# Altium footprint library PCB-Tester-Board-V1.PcbLib: 48 footprints (part 3 of 3)
Each footprint in its own frame and in the unit in brackets; x right, y up, seen from the top. Pads: shape width x height; smd on the part's side, far side on the other; paste and mask are expansions set on the pad; w line width, h text height; cw(c..) or ccw(c..) is an arc to the next point about the centre after c.
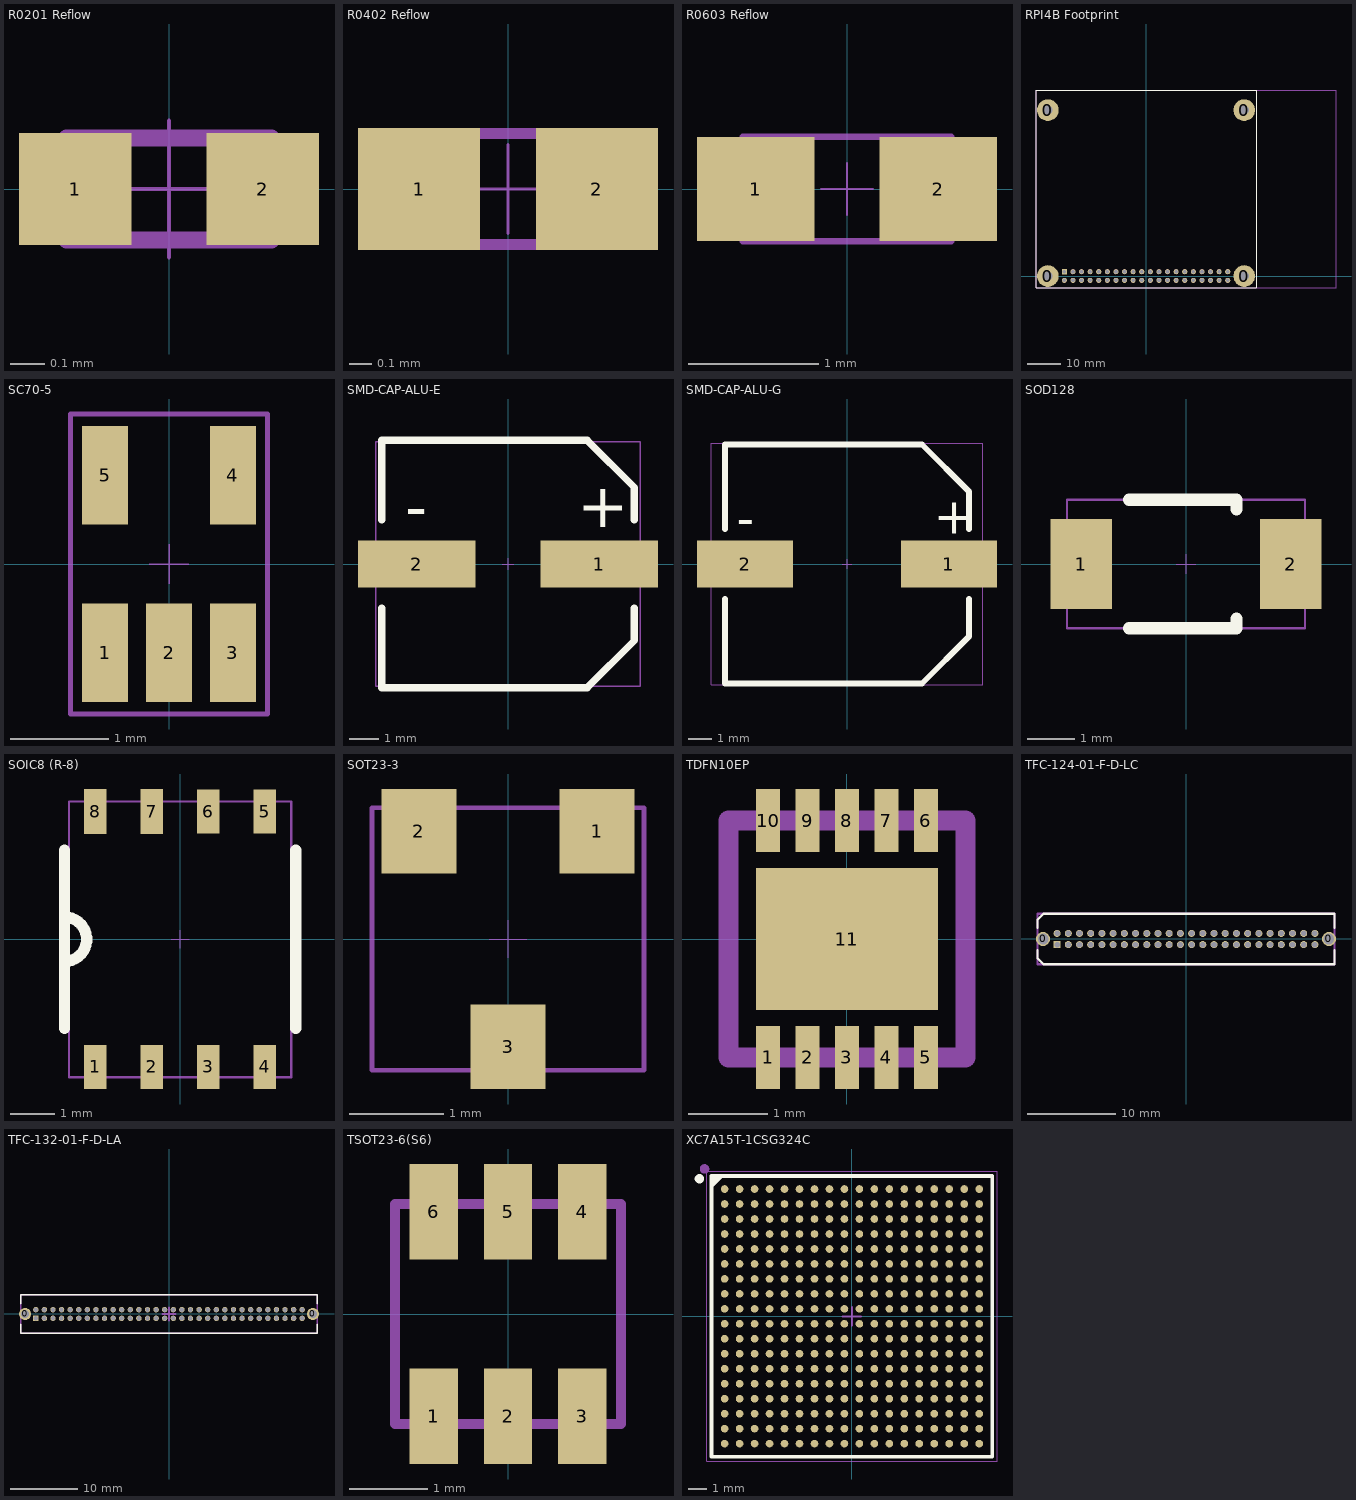
[diagram p2: the footprints below, top view; thin cyan lines are the x and y axes]

## R0201 Reflow [mm] "SMT Resistor 0201 Reflow Soldering"
pads (2):
  rect 0.33x0.33 smd: 1(-0.275,0) 2(0.275,0)
Top Solder:
  rectangle: -0.27,-0.267 0.238,0.267
Top Courtyard:
  lines w0.05: -0.3,-0.15 0.3,-0.15 0.3,0.15 -0.3,0.15 -0.3,-0.15
Mechanical 17:
  lines w0.013: -0.2,0 0.2,0 ; 0,-0.2 0,0.2
3D body "R0201.STEP": height 0.23, standoff 0, extent -0.3,-0.15 0.3,0.15

## R0402 Reflow [mm] "SMT Resistor 0402 Reflow Soldering"
pads (2):
  rect 0.55x0.55 smd: 1(-0.4,0) 2(0.4,0)
Top Solder:
  rectangle: -0.3,-0.377 0.3,0.377
Top Courtyard:
  lines w0.05: -0.5,-0.25 0.5,-0.25 0.5,0.25 -0.5,0.25 -0.5,-0.25
Mechanical 17:
  lines w0.013: -0.2,0 0.2,0 ; 0,-0.2 0,0.2
3D body "R0402.STEP": height 0.35, standoff 0, extent -0.5,-0.25 0.5,0.25

## R0603 Reflow [mm] "SMT Resistor 0603 Reflow Soldering"
pads (2):
  rect 0.9x0.8 smd: 1(-0.7,0) 2(0.7,0)
Top Courtyard:
  lines w0.05: -0.8,-0.4 -0.8,0.4 0.8,0.4 0.8,-0.4 -0.8,-0.4
Mechanical 17:
  lines w0.013: -0.2,0 0.2,0 ; 0,-0.2 0,0.2
3D body "R0603.STEP": height 0.45, standoff 0, extent -0.8,-0.4 0.8,0.4

## RPI4B [mm] "Raspberry Pi 4B"
3D body "RPI4B.STEP": height 19.79, standoff -0.11, extent -32.5,-3.5 56.49,54.9

## RPI4B Footprint [mm] "Footprint for Raspberry Pi 4B"
pads (44):
  round 6.4 hole 2.7 unplated paste-6.5: 0(-29,0) 0(-29,49) 0(29,0) 0(29,49)
  rect 1.5x1.5 hole 1.1 paste-2: 1(-24.13,1.27)
  round 1.5 hole 1.1 paste-2: 2(-24.13,-1.27) 3(-21.59,1.27) 4(-21.59,-1.27) 5(-19.05,1.27) 6(-19.05,-1.27) 7(-16.51,1.27) 8(-16.51,-1.27) 9(-13.97,1.27) 10(-13.97,-1.27) 11(-11.43,1.27) 12(-11.43,-1.27) 13(-8.89,1.27) 14(-8.89,-1.27) 15(-6.35,1.27) 16(-6.35,-1.27) 17(-3.81,1.27) 18(-3.81,-1.27) 19(-1.27,1.27) 20(-1.27,-1.27) 21(1.27,1.27) 22(1.27,-1.27) 23(3.81,1.27) 24(3.81,-1.27) 25(6.35,1.27) 26(6.35,-1.27) 27(8.89,1.27) 28(8.89,-1.27) 29(11.43,1.27) 30(11.43,-1.27) 31(13.97,1.27) 32(13.97,-1.27) 33(16.51,1.27) 34(16.51,-1.27) 35(19.05,1.27) 36(19.05,-1.27) 37(21.59,1.27) 38(21.59,-1.27) 39(24.13,1.27) 40(24.13,-1.27)
Top Overlay:
  lines w0.254: -32.5,-3.5 -32.5,54.9 32.5,54.9 32.5,-3.5 -32.5,-3.5
Top Courtyard:
  lines w0.254: -32.5,-3.5 56.1,-3.5 56.1,54.9 -32.5,54.9 -32.5,-3.5
Mechanical 17:
  circle w0.013: c24.13,1.27 r0.525
  circle w0.013: c21.59,1.27 r0.525
  circle w0.013: c21.59,-1.27 r0.525
  circle w0.013: c19.05,1.27 r0.525
  circle w0.013: c19.05,-1.27 r0.525
  circle w0.013: c16.51,-1.27 r0.525
  circle w0.013: c13.97,1.27 r0.525
  circle w0.013: c13.97,-1.27 r0.525
  circle w0.013: c11.43,-1.27 r0.525
  circle w0.013: c3.81,1.27 r0.525
  circle w0.013: c-13.97,-1.27 r0.525
  circle w0.013: c-29,0 r1.35
  circle w0.013: c29,0 r1.35
  circle w0.013: c29,49 r1.35
  circle w0.013: c-29,49 r1.35
  circle w0.013: c-24.13,-1.27 r0.525
  circle w0.013: c-24.13,1.27 r0.525
  circle w0.013: c-21.59,-1.27 r0.525
  circle w0.013: c-21.59,1.27 r0.525
  circle w0.013: c-19.05,-1.27 r0.525
  circle w0.013: c-19.05,1.27 r0.525
  circle w0.013: c-16.51,-1.27 r0.525
  circle w0.013: c-16.51,1.27 r0.525
  circle w0.013: c-13.97,1.27 r0.525
  circle w0.013: c-11.43,-1.27 r0.525
  circle w0.013: c-11.43,1.27 r0.525
  circle w0.013: c-8.89,-1.27 r0.525
  circle w0.013: c-8.89,1.27 r0.525
  circle w0.013: c-6.35,-1.27 r0.525
  circle w0.013: c-6.35,1.27 r0.525
  circle w0.013: c-3.81,-1.27 r0.525
  circle w0.013: c-3.81,1.27 r0.525
  circle w0.013: c-1.27,-1.27 r0.525
  circle w0.013: c-1.27,1.27 r0.525
  circle w0.013: c1.27,-1.27 r0.525
  circle w0.013: c1.27,1.27 r0.525
  circle w0.013: c3.81,-1.27 r0.525
  circle w0.013: c6.35,-1.27 r0.525
  circle w0.013: c6.35,1.27 r0.525
  circle w0.013: c8.89,-1.27 r0.525
  circle w0.013: c8.89,1.27 r0.525
  circle w0.013: c11.43,1.27 r0.525
  circle w0.013: c16.51,1.27 r0.525
  circle w0.013: c24.13,-1.27 r0.525
3D body "ESW-120-23-L-D-LL.STEP": height 13.59, standoff -4.83, extent -25.654,-2.54 25.654,2.54

## SC70-5 [mm]
pads (5):
  rect 0.47x1 smd: 1(-0.65,-0.9) 2(0,-0.9) 3(0.65,-0.9) 4(0.65,0.9) 5(-0.65,0.9)
Top Courtyard:
  lines w0.05: -1,-1.524 -1,1.524 1,1.524 1,-1.524 -1,-1.524
Mechanical 17:
  lines w0.013: -0.2,0 0.2,0 ; 0,-0.2 0,0.2
3D body "SC70-5.step": height 0.95, standoff 0, extent -1,-1.05 1,1.05

## SMD-CAP-ALU-E [mm] "Ø8.0mm x 6.2mm"
pads (2):
  rect 4x1.6 smd: 1(3.1,0) 2(-3.1,0)
Top Overlay:
  lines w0.254: -4.3,-1.5 -4.3,-4.2 2.7,-4.2 4.3,-2.6 4.3,-1.5 ; -4.3,1.5 -4.3,4.2 2.7,4.2 4.3,2.6 4.3,1.5
  text "+" at 2.35,1.25 h1.52
  text "-" at -3.5,1.2 h1.52
Top Courtyard:
  lines w0.05: -4.5,-4.15 4.5,-4.15 4.5,4.15 -4.5,4.15 -4.5,-4.15
Mechanical 17:
  lines w0.013: -0.2,0 0.2,0 ; 0,-0.2 0,0.2
3D body "SMD-CAP-ALU-E.STEP": height 6.2, standoff 0, extent -4.5,-4.15 4.5,4.15

## SMD-CAP-ALU-G [mm] "Ø10.0mm x 10.2mm"
pads (2):
  rect 4.1x2 smd: 1(4.35,0) 2(-4.35,0)
Top Overlay:
  lines w0.254: -5.2,-1.5 -5.2,-5.1 3.2,-5.1 5.2,-3.1 5.2,-1.5 ; -5.2,1.5 -5.2,5.1 3.2,5.1 5.2,3.1 5.2,1.5
  text "+" at 3.7,1.3 h1.52
  text "-" at -4.7,1.2 h1.52
Top Courtyard:
  lines w0.05: -5.8,-5.15 5.8,-5.15 5.8,5.15 -5.8,5.15 -5.8,-5.15
Mechanical 17:
  lines w0.013: -0.2,0 0.2,0 ; 0,-0.2 0,0.2
3D body "SMD-CAP-ALU-G.STEP": height 10.2, standoff 0, extent -5.8,-5.15 5.8,5.15

## SOD128 [mm] "PMEG4050EP,115"
pads (2):
  rect 1.3x1.9 smd: 1(-2.2,0) 2(2.2,0)
Top Overlay:
  lines w0.254: -1.2,-1.35 1.06,-1.35 1.06,-1.15 ; -1.2,1.35 1.06,1.35 1.06,1.15
Top Courtyard:
  lines w0.05: -2.5,-1.35 -2.5,1.35 2.5,1.35 2.5,-1.35 -2.5,-1.35
Mechanical 17:
  lines w0.013: -0.2,0 0.2,0 ; 0,-0.2 0,0.2
3D body "Schottky_Diode_SOD128.step": height 1.1, standoff -0.01, extent -2.5,-1.35 2.5,1.35

## SOIC8 (R-8) [mil] "Generic 8 lead SOIC Narrow Body"
height 69
pads (8):
  rect 20x39 smd: 1(-75,-113) 2(-25,-113) 3(25,-113) 4(75,-113) 5(75,113) 6(25,113)
  rect 20x40 smd: 7(-25,113) 8(-75,113)
Top Overlay:
  lines w10: -102.36,-78.74 -102.36,78.74 ; -102.36,-19.68 ccw(c-102.36,0) -102.36,19.68 ; 102.36,-78.74 102.36,78.74
Top Courtyard:
  lines w1.97: -98.42,-122.04 98.43,-122.04 98.43,122.06 -98.42,122.06 -98.42,-122.04
Mechanical 17:
  lines w0.51: -7.87,0 7.87,0 ; 0,-7.87 0,7.87
3D body "SOIC8N.step": height 68.9, standoff 0, extent -98.42,-122.04 98.43,122.06

## SOT23-3 [mm]
pads (3):
  rect 0.8x0.9 smd mask+0.1: 1(0.95,1.15) 2(-0.95,1.15) 3(0,-1.15)
Top Courtyard:
  lines w0.05: -1.45,-1.4 -1.45,1.4 1.45,1.4 1.45,-1.4 -1.45,-1.4
Mechanical 17:
  lines w0.013: -0.2,0 0.2,0 ; 0,-0.2 0,0.2
3D body "SOT23-3.step": height 1.3, standoff 0, extent -1.45,-1.4 1.45,1.4

## TDFN10EP [mm] "Microchip TDFN 10 pins, exposed pad"
pads (11):
  rect 0.3x0.8 smd: 1(-1,-1.5) 2(-0.5,-1.5) 3(0,-1.5) 4(0.5,-1.5) 5(1,-1.5) 6(1,1.5) 7(0.5,1.5) 8(0,1.5) 9(-0.5,1.5) 10(-1,1.5)
  rect 2.3x1.8 smd: 11(0,0)
Top Overlay:
  text "." at -1.5,-1.5 h1
Top Courtyard:
  lines w0.254: -1.5,-1.501 -1.5,1.501 1.5,1.501 1.5,-1.501 -1.5,-1.501
3D body "TDFN10EP.STEP": height 0.75, standoff 0, extent -1.5,-1.501 1.5,1.501

## TFC-124-01-F-D-LC [mm] "48 pin box header straight"
pads (50):
  round 1.6 hole 1.19 unplated: 0(-16.192,0) 0(16.192,0)
  rect 0.8x0.8 hole 0.635 paste+0: 1(-14.605,-0.635)
  round 0.8 hole 0.635 paste+0: 2(-14.605,0.635) 3(-13.335,-0.635) 4(-13.335,0.635) 5(-12.065,-0.635) 6(-12.065,0.635) 7(-10.795,-0.635) 8(-10.795,0.635) 9(-9.525,-0.635) 10(-9.525,0.635) 11(-8.255,-0.635) 12(-8.255,0.635) 13(-6.985,-0.635) 14(-6.985,0.635) 15(-5.715,-0.635) 16(-5.715,0.635) 17(-4.445,-0.635) 18(-4.445,0.635) 19(-3.175,-0.635) 20(-3.175,0.635) 21(-1.905,-0.635) 22(-1.905,0.635) 23(-0.635,-0.635) 24(-0.635,0.635) 25(0.635,-0.635) 26(0.635,0.635) 27(1.905,-0.635) 28(1.905,0.635) 29(3.175,-0.635) 30(3.175,0.635) 31(4.445,-0.635) 32(4.445,0.635) 33(5.715,-0.635) 34(5.715,0.635) 35(6.985,-0.635) 36(6.985,0.635) 37(8.255,-0.635) 38(8.255,0.635) 39(9.525,-0.635) 40(9.525,0.635) 41(10.795,-0.635) 42(10.795,0.635) 43(12.065,-0.635) 44(12.065,0.635) 45(13.335,-0.635) 46(13.335,0.635) 47(14.605,-0.635) 48(14.605,0.635)
Top Overlay:
  lines w0.254: -16.828,-1.27 -16.828,-2.173 -16.143,-2.858 16.827,-2.858 16.827,-1.27 ; -16.828,1.27 -16.828,2.172 -16.143,2.857 16.827,2.857 16.827,1.27
Top Courtyard:
  lines w0.254: -16.828,-2.858 -16.828,2.857 16.827,2.857 16.827,-2.858 -16.828,-2.858
3D body "TFC-124-01-F-D-LC.STEP": height 5.59, standoff -1.98, extent -16.828,-2.858 16.827,2.857

## TFC-132-01-F-D-LA [mm] "64 pin box header right angled"
pads (66):
  round 1.778 hole 1.19 unplated paste-1.19: 0(-21.275,0) 0(21.275,0)
  rect 0.8x0.8 hole 0.635 paste+0: 1(-19.685,-0.635)
  round 0.8 hole 0.635 paste+0: 2(-19.685,0.635) 3(-18.415,-0.635) 4(-18.415,0.635) 5(-17.145,-0.635) 6(-17.145,0.635) 7(-15.875,-0.635) 8(-15.875,0.635) 9(-14.605,-0.635) 10(-14.605,0.635) 11(-13.335,-0.635) 12(-13.335,0.635) 13(-12.065,-0.635) 14(-12.065,0.635) 15(-10.795,-0.635) 16(-10.795,0.635) 17(-9.525,-0.635) 18(-9.525,0.635) 19(-8.255,-0.635) 20(-8.255,0.635) 21(-6.985,-0.635) 22(-6.985,0.635) 23(-5.715,-0.635) 24(-5.715,0.635) 25(-4.445,-0.635) 26(-4.445,0.635) 27(-3.175,-0.635) 28(-3.175,0.635) 29(-1.905,-0.635) 30(-1.905,0.635) 31(-0.635,-0.635) 32(-0.635,0.635) 33(0.635,-0.635) 34(0.635,0.635) 35(1.905,-0.635) 36(1.905,0.635) 37(3.175,-0.635) 38(3.175,0.635) 39(4.445,-0.635) 40(4.445,0.635) 41(5.715,-0.635) 42(5.715,0.635) 43(6.985,-0.635) 44(6.985,0.635) 45(8.255,-0.635) 46(8.255,0.635) 47(9.525,-0.635) 48(9.525,0.635)
  round 0.8 hole 0.635 paste-1: 49(10.795,-0.635) 50(10.795,0.635) 51(12.065,-0.635) 52(12.065,0.635) 53(13.335,-0.635) 54(13.335,0.635) 55(14.605,-0.635) 56(14.605,0.635) 57(15.875,-0.635) 58(15.875,0.635) 59(17.145,-0.635) 60(17.145,0.635) 61(18.415,-0.635) 62(18.415,0.635) 63(19.685,-0.635) 64(19.685,0.635)
Top Overlay:
  lines w0.254: -21.908,-1.5 -21.908,-2.858 21.907,-2.858 21.907,-1.5 ; -21.908,1.5 -21.908,2.857 21.907,2.857 21.907,1.5
Top Courtyard:
  lines w0.254: -21.908,-2.858 -21.908,2.857 21.907,2.857 21.907,-2.858 -21.908,-2.858
Mechanical 17:
  lines w0.254: -1,0 1,0 ; 0,-1 0,1
3D body "TFC-132-01-F-D-LC.STEP": height 5.59, standoff -1.98, extent -21.908,-2.858 21.907,2.857

## TSOT23-6(S6) [mm] "6-Lead Plastic TSOT-23"
pads (6):
  rect 0.62x1.225 smd: 1(-0.95,-1.31) 2(0,-1.31) 3(0.95,-1.31) 4(0.95,1.31) 5(0,1.31) 6(-0.95,1.31)
Top Overlay:
  text "." at -1.8,-1.5 h1
Top Courtyard:
  lines w0.127: -1.45,-1.412 -1.45,1.412 1.45,1.412 1.45,-1.412 -1.45,-1.412
3D body "TSOT-23-6(S6).STEP": height 1, standoff 0, extent -1.45,-1.412 1.45,1.412

## XC7A15T-1CSG324C [mm] "BGA, 324-Leads, Body 15.00x15.00mmx1.50mm, Pitch 0.80mm"
height 1.5
pads (324):
  round 0.41 smd: A1(-6.8,6.8) A2(-6,6.8) A3(-5.2,6.8) A4(-4.4,6.8) A5(-3.6,6.8) A6(-2.8,6.8) A7(-2,6.8) A8(-1.2,6.8) A9(-0.4,6.8) A10(0.4,6.8) A11(1.2,6.8) A12(2,6.8) A13(2.8,6.8) A14(3.6,6.8) A15(4.4,6.8) A16(5.2,6.8) A17(6,6.8) A18(6.8,6.8) B1(-6.8,6) B2(-6,6) B3(-5.2,6) B4(-4.4,6) B5(-3.6,6) B6(-2.8,6) B7(-2,6) B8(-1.2,6) B9(-0.4,6) B10(0.4,6) B11(1.2,6) B12(2,6) B13(2.8,6) B14(3.6,6) B15(4.4,6) B16(5.2,6) B17(6,6) B18(6.8,6) C1(-6.8,5.2) C2(-6,5.2) C3(-5.2,5.2) C4(-4.4,5.2) C5(-3.6,5.2) C6(-2.8,5.2) C7(-2,5.2) C8(-1.2,5.2) C9(-0.4,5.2) C10(0.4,5.2) C11(1.2,5.2) C12(2,5.2) C13(2.8,5.2) C14(3.6,5.2) C15(4.4,5.2) C16(5.2,5.2) C17(6,5.2) C18(6.8,5.2) D1(-6.8,4.4) D2(-6,4.4) D3(-5.2,4.4) D4(-4.4,4.4) D5(-3.6,4.4) D6(-2.8,4.4) D7(-2,4.4) D8(-1.2,4.4) D9(-0.4,4.4) D10(0.4,4.4) D11(1.2,4.4) D12(2,4.4) D13(2.8,4.4) D14(3.6,4.4) D15(4.4,4.4) D16(5.2,4.4) D17(6,4.4) D18(6.8,4.4) E1(-6.8,3.6) E2(-6,3.6) E3(-5.2,3.6) E4(-4.4,3.6) E5(-3.6,3.6) E6(-2.8,3.6) E7(-2,3.6) E8(-1.2,3.6) E9(-0.4,3.6) E10(0.4,3.6) E11(1.2,3.6) E12(2,3.6) E13(2.8,3.6) E14(3.6,3.6) E15(4.4,3.6) E16(5.2,3.6) E17(6,3.6) E18(6.8,3.6) F1(-6.8,2.8) F2(-6,2.8) F3(-5.2,2.8) F4(-4.4,2.8) F5(-3.6,2.8) F6(-2.8,2.8) F7(-2,2.8) F8(-1.2,2.8) F9(-0.4,2.8) F10(0.4,2.8) F11(1.2,2.8) F12(2,2.8) F13(2.8,2.8) F14(3.6,2.8) F15(4.4,2.8) F16(5.2,2.8) F17(6,2.8) F18(6.8,2.8) G1(-6.8,2) G2(-6,2) G3(-5.2,2) G4(-4.4,2) G5(-3.6,2) G6(-2.8,2) G7(-2,2) G8(-1.2,2) G9(-0.4,2) G10(0.4,2) G11(1.2,2) G12(2,2) G13(2.8,2) G14(3.6,2) G15(4.4,2) G16(5.2,2) G17(6,2) G18(6.8,2) H1(-6.8,1.2) H2(-6,1.2) H3(-5.2,1.2) H4(-4.4,1.2) H5(-3.6,1.2) H6(-2.8,1.2) H7(-2,1.2) H8(-1.2,1.2) H9(-0.4,1.2) H10(0.4,1.2) H11(1.2,1.2) H12(2,1.2) H13(2.8,1.2) H14(3.6,1.2) H15(4.4,1.2) H16(5.2,1.2) H17(6,1.2) H18(6.8,1.2) J1(-6.8,0.4) J2(-6,0.4) J3(-5.2,0.4) J4(-4.4,0.4) J5(-3.6,0.4) J6(-2.8,0.4) J7(-2,0.4) J8(-1.2,0.4) J9(-0.4,0.4) J10(0.4,0.4) J11(1.2,0.4) J12(2,0.4) J13(2.8,0.4) J14(3.6,0.4) J15(4.4,0.4) J16(5.2,0.4) J17(6,0.4) J18(6.8,0.4) K1(-6.8,-0.4) K2(-6,-0.4) K3(-5.2,-0.4) K4(-4.4,-0.4) K5(-3.6,-0.4) K6(-2.8,-0.4) K7(-2,-0.4) K8(-1.2,-0.4) K9(-0.4,-0.4) K10(0.4,-0.4) K11(1.2,-0.4) K12(2,-0.4) K13(2.8,-0.4) K14(3.6,-0.4) K15(4.4,-0.4) K16(5.2,-0.4) K17(6,-0.4) K18(6.8,-0.4) L1(-6.8,-1.2) L2(-6,-1.2) L3(-5.2,-1.2) L4(-4.4,-1.2) L5(-3.6,-1.2) L6(-2.8,-1.2) L7(-2,-1.2) L8(-1.2,-1.2) L9(-0.4,-1.2) L10(0.4,-1.2) L11(1.2,-1.2) L12(2,-1.2) L13(2.8,-1.2) L14(3.6,-1.2) L15(4.4,-1.2) L16(5.2,-1.2) L17(6,-1.2) L18(6.8,-1.2) M1(-6.8,-2) M2(-6,-2) M3(-5.2,-2) M4(-4.4,-2) M5(-3.6,-2) M6(-2.8,-2) M7(-2,-2) M8(-1.2,-2) M9(-0.4,-2) M10(0.4,-2) M11(1.2,-2) M12(2,-2) M13(2.8,-2) M14(3.6,-2) M15(4.4,-2) M16(5.2,-2) M17(6,-2) M18(6.8,-2) N1(-6.8,-2.8) N2(-6,-2.8) N3(-5.2,-2.8) N4(-4.4,-2.8) N5(-3.6,-2.8) N6(-2.8,-2.8) N7(-2,-2.8) N8(-1.2,-2.8) N9(-0.4,-2.8) N10(0.4,-2.8) N11(1.2,-2.8) N12(2,-2.8) N13(2.8,-2.8) N14(3.6,-2.8) N15(4.4,-2.8) N16(5.2,-2.8) N17(6,-2.8) N18(6.8,-2.8) P1(-6.8,-3.6) P2(-6,-3.6) P3(-5.2,-3.6) P4(-4.4,-3.6) P5(-3.6,-3.6) P6(-2.8,-3.6) P7(-2,-3.6) P8(-1.2,-3.6) P9(-0.4,-3.6) P10(0.4,-3.6) P11(1.2,-3.6) P12(2,-3.6) P13(2.8,-3.6) P14(3.6,-3.6) P15(4.4,-3.6) P16(5.2,-3.6) P17(6,-3.6) P18(6.8,-3.6) R1(-6.8,-4.4) R2(-6,-4.4) R3(-5.2,-4.4) R4(-4.4,-4.4) R5(-3.6,-4.4) R6(-2.8,-4.4) R7(-2,-4.4) R8(-1.2,-4.4) R9(-0.4,-4.4) R10(0.4,-4.4) R11(1.2,-4.4) R12(2,-4.4) R13(2.8,-4.4) R14(3.6,-4.4) R15(4.4,-4.4) R16(5.2,-4.4) R17(6,-4.4) R18(6.8,-4.4) T1(-6.8,-5.2) T2(-6,-5.2) T3(-5.2,-5.2) T4(-4.4,-5.2) T5(-3.6,-5.2) T6(-2.8,-5.2) T7(-2,-5.2) T8(-1.2,-5.2) T9(-0.4,-5.2) T10(0.4,-5.2) T11(1.2,-5.2) T12(2,-5.2) T13(2.8,-5.2) T14(3.6,-5.2) T15(4.4,-5.2) T16(5.2,-5.2) T17(6,-5.2) T18(6.8,-5.2) U1(-6.8,-6) U2(-6,-6) U3(-5.2,-6) U4(-4.4,-6) U5(-3.6,-6) U6(-2.8,-6) U7(-2,-6) U8(-1.2,-6) U9(-0.4,-6) U10(0.4,-6) U11(1.2,-6) U12(2,-6) U13(2.8,-6) U14(3.6,-6) U15(4.4,-6) U16(5.2,-6) U17(6,-6) U18(6.8,-6) V1(-6.8,-6.8) V2(-6,-6.8) V3(-5.2,-6.8) V4(-4.4,-6.8) V5(-3.6,-6.8) V6(-2.8,-6.8) V7(-2,-6.8) V8(-1.2,-6.8) V9(-0.4,-6.8) V10(0.4,-6.8) V11(1.2,-6.8) V12(2,-6.8) V13(2.8,-6.8) V14(3.6,-6.8) V15(4.4,-6.8) V16(5.2,-6.8) V17(6,-6.8) V18(6.8,-6.8)
Top Overlay:
  circle w0.25: c-8.15,7.35 r0.125
  region: -6.956,7.5 -7.5,6.956 -7.5,7.5
  lines w0.2: -7.5,6.956 -6.956,7.5 ; -7.5,-7.5 -7.5,7.5 7.5,7.5 7.5,-7.5 -7.5,-7.5
Top Component Outline:
  circle w0.254: c-7.874,7.874 r0.127
Top Courtyard:
  lines w0.05: -7.75,-7.75 -7.75,7.75 7.75,7.75 7.75,-7.75 -7.75,-7.75
Mechanical 17:
  lines w0.1: -0.5,0 0.5,0 ; 0,-0.5 0,0.5
3D body "XC7A15T-1CSG324C.STEP": height 1.5, standoff 0, extent -7.5,-7.5 7.5,7.5